# Altium integrated library LEMO Unipole And Multipole Type Connectors.IntLib: 1566 symbols (part 12 of 13) (continued)
## PKG.M1.0GL.NG
designator J?
Fixed receptacle with two nuts (back panel mounting), straight print contacts, Key (G), P series, Multipole Type with 10 Contacts; Manufacturer: LEMO; PartNumber: PKG.M1.0GL.NG; Number of contacts: 10; Contact Diameter: 0.5 mm; Test voltage (kV rms) Contact-Contact: 0.85; Rated Current(A): 3; DatasheetVersion: Jun-14; PackageReference: PKG.M1.0GL.NG; PackageDescription: Fixed receptacle with two nuts (back panel mounting), straight print contacts, Key(G) for Printed Circuit; Supplier 1: Mouser; Supplier Part Number 1: 736-PKGM10GLNG; Supplier 2: Digi-Key; Supplier Part Number 2: PKG.M1.0GL.NG-ND; ComponentLink1Description: Manufacturer URL; ComponentLink1URL: http://www.lemo.com; ComponentLink2Description: Datasheet; ComponentLink2URL: http://intra.lemo.ch/catalog/ROW/UK_English/P_series_catalog.pdf
footprint PKG.M1.0GL.NG (Socket, Female, Height 33.5 mm, Through hole)
pins: 1, 2, 3, 4, 5, 6, 7, 8, 9, 10

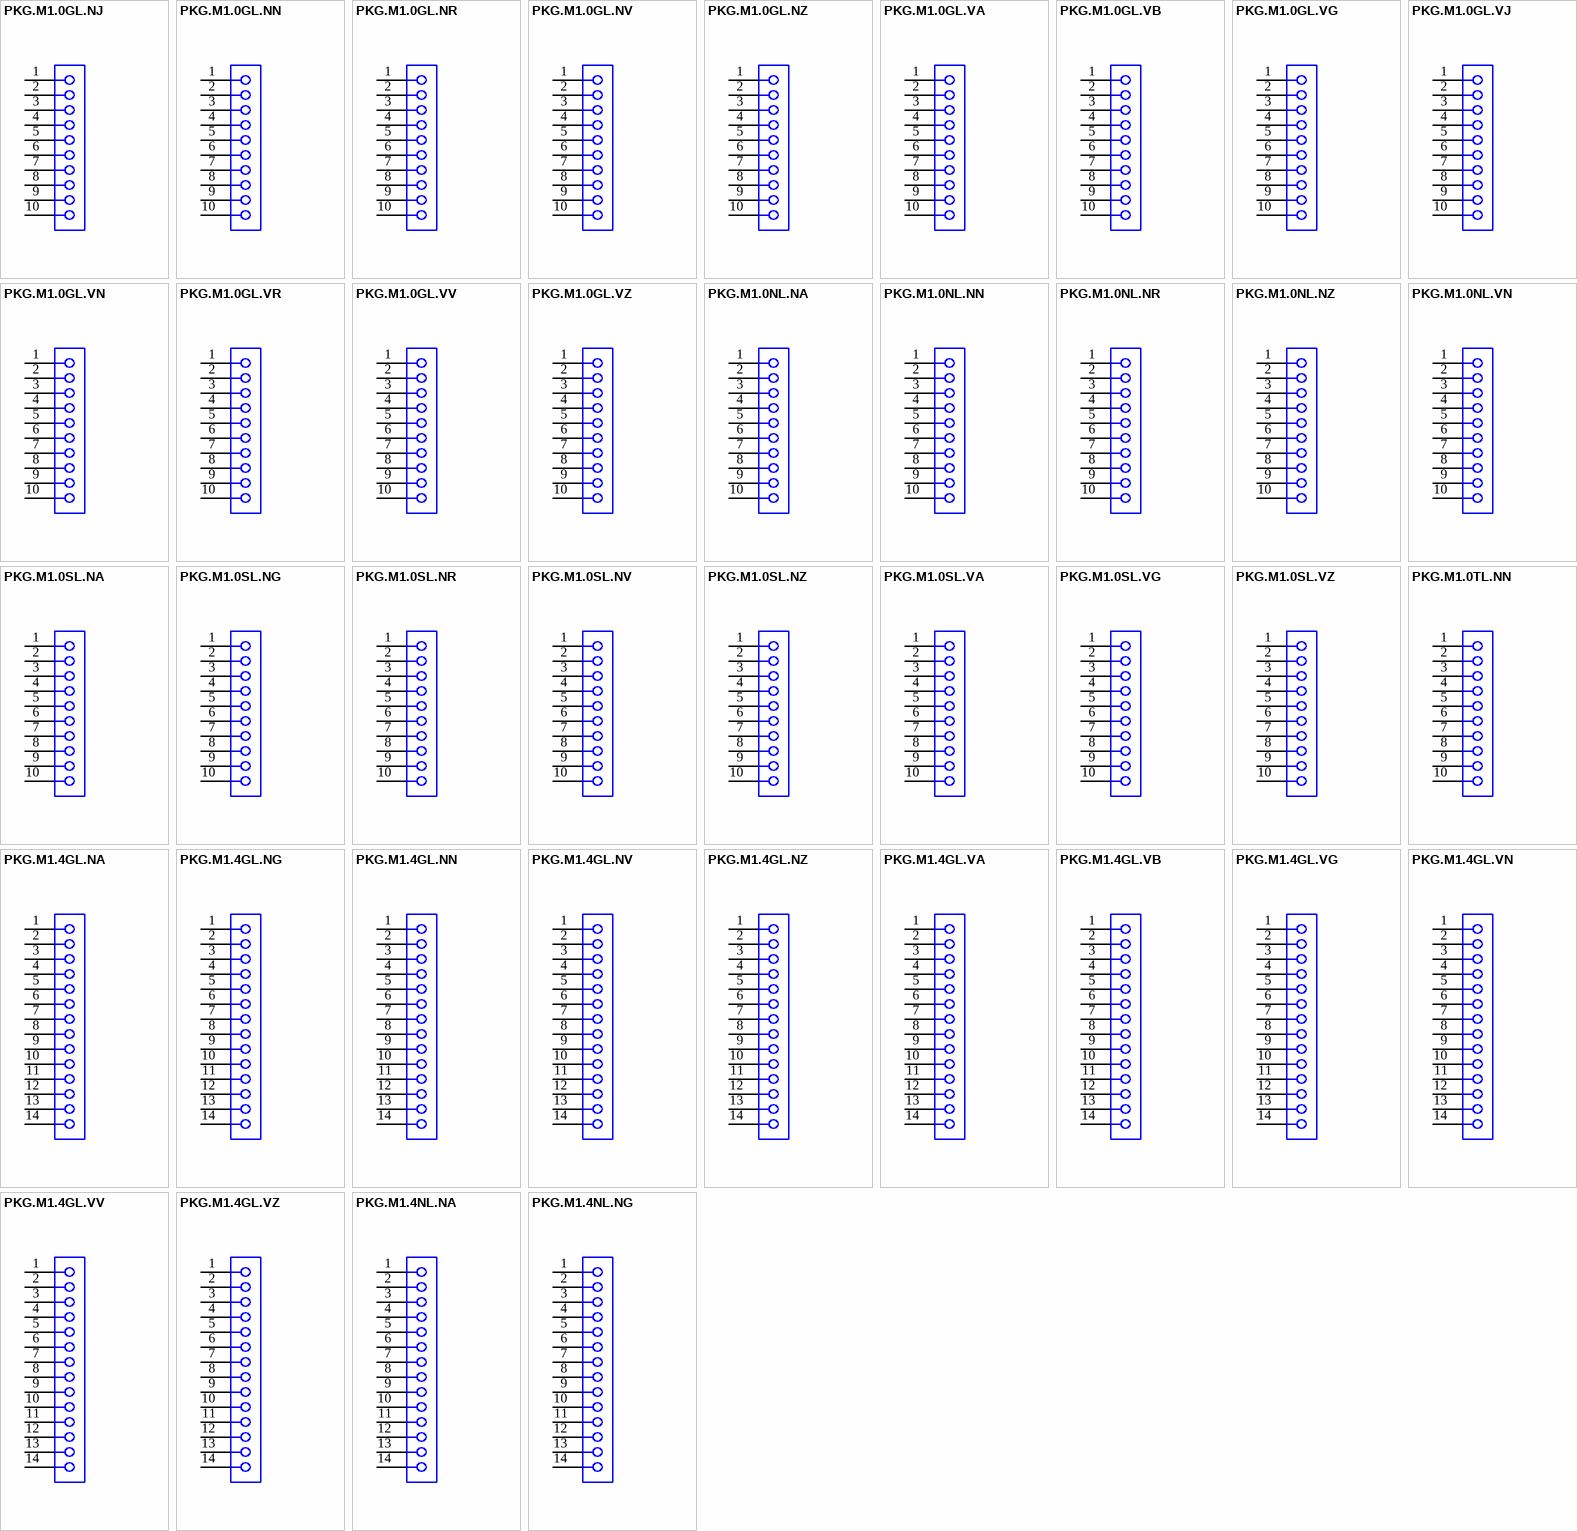
[diagram p39: symbols PKG.M1.0GL.NJ to PKG.M1.4NL.NG]

## PKG.M1.0GL.NJ
designator J?
Fixed receptacle with two nuts (back panel mounting), straight print contacts, Key (G), P series, Multipole Type with 10 Contacts; Manufacturer: LEMO; PartNumber: PKG.M1.0GL.NJ; Number of contacts: 10; Contact Diameter: 0.5 mm; Test voltage (kV rms) Contact-Contact: 0.85; Rated Current(A): 3; DatasheetVersion: Jun-14; PackageReference: PKG.M1.0GL.NJ; PackageDescription: Fixed receptacle with two nuts (back panel mounting), straight print contacts, Key(G) for Printed Circuit; ComponentLink1Description: Manufacturer URL; ComponentLink1URL: http://www.lemo.com; ComponentLink2Description: Datasheet; ComponentLink2URL: http://intra.lemo.ch/catalog/ROW/UK_English/P_series_catalog.pdf
footprint PKG.M1.0GL.NJ (Socket, Female, Height 33.5 mm, Through hole)
pins: 1, 2, 3, 4, 5, 6, 7, 8, 9, 10

## PKG.M1.0GL.NN
designator J?
Fixed receptacle with two nuts (back panel mounting), straight print contacts, Key (G), P series, Multipole Type with 10 Contacts; Manufacturer: LEMO; PartNumber: PKG.M1.0GL.NN; Number of contacts: 10; Contact Diameter: 0.5 mm; Test voltage (kV rms) Contact-Contact: 0.85; Rated Current(A): 3; DatasheetVersion: Jun-14; PackageReference: PKG.M1.0GL.NN; PackageDescription: Fixed receptacle with two nuts (back panel mounting), straight print contacts, Key(G) for Printed Circuit; ComponentLink1Description: Manufacturer URL; ComponentLink1URL: http://www.lemo.com; ComponentLink2Description: Datasheet; ComponentLink2URL: http://intra.lemo.ch/catalog/ROW/UK_English/P_series_catalog.pdf
footprint PKG.M1.0GL.NN (Socket, Female, Height 33.5 mm, Through hole)
pins: 1, 2, 3, 4, 5, 6, 7, 8, 9, 10

## PKG.M1.0GL.NR
designator J?
Fixed receptacle with two nuts (back panel mounting), straight print contacts, Key (G), P series, Multipole Type with 10 Contacts; Manufacturer: LEMO; PartNumber: PKG.M1.0GL.NR; Number of contacts: 10; Contact Diameter: 0.5 mm; Test voltage (kV rms) Contact-Contact: 0.85; Rated Current(A): 3; DatasheetVersion: Jun-14; PackageReference: PKG.M1.0GL.NR; PackageDescription: Fixed receptacle with two nuts (back panel mounting), straight print contacts, Key(G) for Printed Circuit; ComponentLink1Description: Manufacturer URL; ComponentLink1URL: http://www.lemo.com; ComponentLink2Description: Datasheet; ComponentLink2URL: http://intra.lemo.ch/catalog/ROW/UK_English/P_series_catalog.pdf
footprint PKG.M1.0GL.NR (Socket, Female, Height 33.5 mm, Through hole)
pins: 1, 2, 3, 4, 5, 6, 7, 8, 9, 10

## PKG.M1.0GL.NV
designator J?
Fixed receptacle with two nuts (back panel mounting), straight print contacts, Key (G), P series, Multipole Type with 10 Contacts; Manufacturer: LEMO; PartNumber: PKG.M1.0GL.NV; Number of contacts: 10; Contact Diameter: 0.5 mm; Test voltage (kV rms) Contact-Contact: 0.85; Rated Current(A): 3; DatasheetVersion: Jun-14; PackageReference: PKG.M1.0GL.NV; PackageDescription: Fixed receptacle with two nuts (back panel mounting), straight print contacts, Key(G) for Printed Circuit; ComponentLink1Description: Manufacturer URL; ComponentLink1URL: http://www.lemo.com; ComponentLink2Description: Datasheet; ComponentLink2URL: http://intra.lemo.ch/catalog/ROW/UK_English/P_series_catalog.pdf
footprint PKG.M1.0GL.NV (Socket, Female, Height 33.5 mm, Through hole)
pins: 1, 2, 3, 4, 5, 6, 7, 8, 9, 10

## PKG.M1.0GL.NZ
designator J?
Fixed receptacle with 1 nut (without 2nd front nut), Key (G), P series, Multipole Type with 10 Contacts; Manufacturer: LEMO; PartNumber: PKG.M1.0GL.NZ; Number of contacts: 10; Contact Diameter: 0.5 mm; Test voltage (kV rms) Contact-Contact: 0.85; Rated Current(A): 3; DatasheetVersion: Jun-14; PackageReference: PKG.M1.0GL.NZ; PackageDescription: Fixed receptacle with 1 nut (without 2nd front nut), Key(G) for Printed Circuit; Supplier 1: Mouser; Supplier Part Number 1: 736-PKGM10GLNZ; Supplier 2: Digi-Key; Supplier Part Number 2: PKG.M1.0GL.NZ-ND; ComponentLink1Description: Manufacturer URL; ComponentLink1URL: http://www.lemo.com; ComponentLink2Description: Datasheet; ComponentLink2URL: http://intra.lemo.ch/catalog/ROW/UK_English/P_series_catalog.pdf
footprint PKG.M1.0GL.NZ (Socket, Female, Height 25 mm, Through hole)
pins: 1, 2, 3, 4, 5, 6, 7, 8, 9, 10

## PKG.M1.0GL.VA
designator J?
Fixed receptacle with two nuts (back panel mounting), 90° print contacts, Key (G), P series, Multipole Type with 10 Contacts; Manufacturer: LEMO; PartNumber: PKG.M1.0GL.VA; Number of contacts: 10; Contact Diameter: 0.5 mm; Test voltage (kV rms) Contact-Contact: 0.85; Rated Current(A): 3; DatasheetVersion: Jun-14; PackageReference: PKG.M1.0GL.VA; PackageDescription: Fixed receptacle with two nuts (back panel mounting), 90° print contacts, Key(G) for Printed Circuit; Supplier 1: Mouser; Supplier Part Number 1: N/A; ComponentLink1Description: Manufacturer URL; ComponentLink1URL: http://www.lemo.com; ComponentLink2Description: Datasheet; ComponentLink2URL: http://intra.lemo.ch/catalog/ROW/UK_English/P_series_catalog.pdf
footprint PKG.M1.0GL.VA (Socket, Female, Height 33.5 mm, Through hole)
pins: 1, 2, 3, 4, 5, 6, 7, 8, 9, 10

## PKG.M1.0GL.VB
designator J?
Fixed receptacle with two nuts (back panel mounting), 90° print contacts, Key (G), P series, Multipole Type with 10 Contacts; Manufacturer: LEMO; PartNumber: PKG.M1.0GL.VB; Number of contacts: 10; Contact Diameter: 0.5 mm; Test voltage (kV rms) Contact-Contact: 0.85; Rated Current(A): 3; DatasheetVersion: Jun-14; PackageReference: PKG.M1.0GL.VB; PackageDescription: Fixed receptacle with two nuts (back panel mounting), 90° print contacts, Key(G) for Printed Circuit; ComponentLink1Description: Manufacturer URL; ComponentLink1URL: http://www.lemo.com; ComponentLink2Description: Datasheet; ComponentLink2URL: http://intra.lemo.ch/catalog/ROW/UK_English/P_series_catalog.pdf
footprint PKG.M1.0GL.VB (Socket, Female, Height 33.5 mm, Through hole)
pins: 1, 2, 3, 4, 5, 6, 7, 8, 9, 10

## PKG.M1.0GL.VG
designator J?
Fixed receptacle with two nuts (back panel mounting), 90° print contacts, Key (G), P series, Multipole Type with 10 Contacts; Manufacturer: LEMO; PartNumber: PKG.M1.0GL.VG; Number of contacts: 10; Contact Diameter: 0.5 mm; Test voltage (kV rms) Contact-Contact: 0.85; Rated Current(A): 3; DatasheetVersion: Jun-14; PackageReference: PKG.M1.0GL.VG; PackageDescription: Fixed receptacle with two nuts (back panel mounting), 90° print contacts, Key(G) for Printed Circuit; Supplier 1: Mouser; Supplier Part Number 1: 736-PKG.M1.0GL.VG; Supplier 2: Digi-Key; Supplier Part Number 2: PKG.M1.0GL.VG-ND; ComponentLink1Description: Manufacturer URL; ComponentLink1URL: http://www.lemo.com; ComponentLink2Description: Datasheet; ComponentLink2URL: http://intra.lemo.ch/catalog/ROW/UK_English/P_series_catalog.pdf
footprint PKG.M1.0GL.VG (Socket, Female, Height 33.5 mm, Through hole)
pins: 1, 2, 3, 4, 5, 6, 7, 8, 9, 10

## PKG.M1.0GL.VJ
designator J?
Fixed receptacle with two nuts (back panel mounting), 90° print contacts, Key (G), P series, Multipole Type with 10 Contacts; Manufacturer: LEMO; PartNumber: PKG.M1.0GL.VJ; Number of contacts: 10; Contact Diameter: 0.5 mm; Test voltage (kV rms) Contact-Contact: 0.85; Rated Current(A): 3; DatasheetVersion: Jun-14; PackageReference: PKG.M1.0GL.VJ; PackageDescription: Fixed receptacle with two nuts (back panel mounting), 90° print contacts, Key(G) for Printed Circuit; ComponentLink1Description: Manufacturer URL; ComponentLink1URL: http://www.lemo.com; ComponentLink2Description: Datasheet; ComponentLink2URL: http://intra.lemo.ch/catalog/ROW/UK_English/P_series_catalog.pdf
footprint PKG.M1.0GL.VJ (Socket, Female, Height 33.5 mm, Through hole)
pins: 1, 2, 3, 4, 5, 6, 7, 8, 9, 10

## PKG.M1.0GL.VN
designator J?
Fixed receptacle with two nuts (back panel mounting), 90° print contacts, Key (G), P series, Multipole Type with 10 Contacts; Manufacturer: LEMO; PartNumber: PKG.M1.0GL.VN; Number of contacts: 10; Contact Diameter: 0.5 mm; Test voltage (kV rms) Contact-Contact: 0.85; Rated Current(A): 3; DatasheetVersion: Jun-14; PackageReference: PKG.M1.0GL.VN; PackageDescription: Fixed receptacle with two nuts (back panel mounting), 90° print contacts, Key(G) for Printed Circuit; ComponentLink1Description: Manufacturer URL; ComponentLink1URL: http://www.lemo.com; ComponentLink2Description: Datasheet; ComponentLink2URL: http://intra.lemo.ch/catalog/ROW/UK_English/P_series_catalog.pdf
footprint PKG.M1.0GL.VN (Socket, Female, Height 33.5 mm, Through hole)
pins: 1, 2, 3, 4, 5, 6, 7, 8, 9, 10

## PKG.M1.0GL.VR
designator J?
Fixed receptacle with two nuts (back panel mounting), 90° print contacts, Key (G), P series, Multipole Type with 10 Contacts; Manufacturer: LEMO; PartNumber: PKG.M1.0GL.VR; Number of contacts: 10; Contact Diameter: 0.5 mm; Test voltage (kV rms) Contact-Contact: 0.85; Rated Current(A): 3; DatasheetVersion: Jun-14; PackageReference: PKG.M1.0GL.VR; PackageDescription: Fixed receptacle with two nuts (back panel mounting), 90° print contacts, Key(G) for Printed Circuit; ComponentLink1Description: Manufacturer URL; ComponentLink1URL: http://www.lemo.com; ComponentLink2Description: Datasheet; ComponentLink2URL: http://intra.lemo.ch/catalog/ROW/UK_English/P_series_catalog.pdf
footprint PKG.M1.0GL.VR (Socket, Female, Height 33.5 mm, Through hole)
pins: 1, 2, 3, 4, 5, 6, 7, 8, 9, 10

## PKG.M1.0GL.VV
designator J?
Fixed receptacle with two nuts (back panel mounting), 90° print contacts, Key (G), P series, Multipole Type with 10 Contacts; Manufacturer: LEMO; PartNumber: PKG.M1.0GL.VV; Number of contacts: 10; Contact Diameter: 0.5 mm; Test voltage (kV rms) Contact-Contact: 0.85; Rated Current(A): 3; DatasheetVersion: Jun-14; PackageReference: PKG.M1.0GL.VV; PackageDescription: Fixed receptacle with two nuts (back panel mounting), 90° print contacts, Key(G) for Printed Circuit; ComponentLink1Description: Manufacturer URL; ComponentLink1URL: http://www.lemo.com; ComponentLink2Description: Datasheet; ComponentLink2URL: http://intra.lemo.ch/catalog/ROW/UK_English/P_series_catalog.pdf
footprint PKG.M1.0GL.VV (Socket, Female, Height 33.5 mm, Through hole)
pins: 1, 2, 3, 4, 5, 6, 7, 8, 9, 10

## PKG.M1.0GL.VZ
designator J?
Fixed receptacle with 1 nut (without 2nd front nut), Key (G), P series, Multipole Type with 10 Contacts; Manufacturer: LEMO; PartNumber: PKG.M1.0GL.VZ; Number of contacts: 10; Contact Diameter: 0.5 mm; Test voltage (kV rms) Contact-Contact: 0.85; Rated Current(A): 3; DatasheetVersion: Jun-14; PackageReference: PKG.M1.0GL.VZ; PackageDescription: Fixed receptacle with 1 nut (without 2nd front nut), Key(G) for Printed Circuit; Supplier 1: Mouser; Supplier Part Number 1: 736-PKGM10GLVZ; ComponentLink1Description: Manufacturer URL; ComponentLink1URL: http://www.lemo.com; ComponentLink2Description: Datasheet; ComponentLink2URL: http://intra.lemo.ch/catalog/ROW/UK_English/P_series_catalog.pdf
footprint PKG.M1.0GL.VZ (Socket, Female, Height 33.5 mm, Through hole)
pins: 1, 2, 3, 4, 5, 6, 7, 8, 9, 10

## PKG.M1.0NL.NA
designator J?
Fixed receptacle with two nuts (back panel mounting), straight print contacts, Key (G), P series, Multipole Type with 10 Contacts; Manufacturer: LEMO; PartNumber: PKG.M1.0NL.NA; Number of contacts: 10; Contact Diameter: 0.5 mm; Test voltage (kV rms) Contact-Contact: 0.85; Rated Current(A): 3; DatasheetVersion: Jun-14; PackageReference: PKG.M1.0NL.NA; PackageDescription: Fixed receptacle with two nuts (back panel mounting), straight print contacts, Key(G) for Printed Circuit; ComponentLink1Description: Manufacturer URL; ComponentLink1URL: http://www.lemo.com; ComponentLink2Description: Datasheet; ComponentLink2URL: http://intra.lemo.ch/catalog/ROW/UK_English/P_series_catalog.pdf
footprint PKG.M1.0NL.NA (Socket, Female, Height 33.5 mm, Through hole)
pins: 1, 2, 3, 4, 5, 6, 7, 8, 9, 10

## PKG.M1.0NL.NN
designator J?
Fixed receptacle with two nuts (back panel mounting), straight print contacts, Key (G), P series, Multipole Type with 10 Contacts; Manufacturer: LEMO; PartNumber: PKG.M1.0NL.NN; Number of contacts: 10; Contact Diameter: 0.5 mm; Test voltage (kV rms) Contact-Contact: 0.85; Rated Current(A): 3; DatasheetVersion: Jun-14; PackageReference: PKG.M1.0NL.NN; PackageDescription: Fixed receptacle with two nuts (back panel mounting), straight print contacts, Key(G) for Printed Circuit; ComponentLink1Description: Manufacturer URL; ComponentLink1URL: http://www.lemo.com; ComponentLink2Description: Datasheet; ComponentLink2URL: http://intra.lemo.ch/catalog/ROW/UK_English/P_series_catalog.pdf
footprint PKG.M1.0NL.NN (Socket, Female, Height 33.5 mm, Through hole)
pins: 1, 2, 3, 4, 5, 6, 7, 8, 9, 10

## PKG.M1.0NL.NR
designator J?
Fixed receptacle with two nuts (back panel mounting), straight print contacts, Key (G), P series, Multipole Type with 10 Contacts; Manufacturer: LEMO; PartNumber: PKG.M1.0NL.NR; Number of contacts: 10; Contact Diameter: 0.5 mm; Test voltage (kV rms) Contact-Contact: 0.85; Rated Current(A): 3; DatasheetVersion: Jun-14; PackageReference: PKG.M1.0NL.NR; PackageDescription: Fixed receptacle with two nuts (back panel mounting), straight print contacts, Key(G) for Printed Circuit; ComponentLink1Description: Manufacturer URL; ComponentLink1URL: http://www.lemo.com; ComponentLink2Description: Datasheet; ComponentLink2URL: http://intra.lemo.ch/catalog/ROW/UK_English/P_series_catalog.pdf
footprint PKG.M1.0NL.NR (Socket, Female, Height 33.5 mm, Through hole)
pins: 1, 2, 3, 4, 5, 6, 7, 8, 9, 10

## PKG.M1.0NL.NZ
designator J?
Fixed receptacle with 1 nut (without 2nd front nut), Key (G), P series, Multipole Type with 10 Contacts; Manufacturer: LEMO; PartNumber: PKG.M1.0NL.NZ; Number of contacts: 10; Contact Diameter: 0.5 mm; Test voltage (kV rms) Contact-Contact: 0.85; Rated Current(A): 3; DatasheetVersion: Jun-14; PackageReference: PKG.M1.0NL.NZ; PackageDescription: Fixed receptacle with 1 nut (without 2nd front nut), Key(G) for Printed Circuit; ComponentLink1Description: Manufacturer URL; ComponentLink1URL: http://www.lemo.com; ComponentLink2Description: Datasheet; ComponentLink2URL: http://intra.lemo.ch/catalog/ROW/UK_English/P_series_catalog.pdf
footprint PKG.M1.0NL.NZ (Socket, Female, Height 25 mm, Through hole)
pins: 1, 2, 3, 4, 5, 6, 7, 8, 9, 10

## PKG.M1.0NL.VN
designator J?
Fixed receptacle with two nuts (back panel mounting), 90° print contacts, Key (G), P series, Multipole Type with 10 Contacts; Manufacturer: LEMO; PartNumber: PKG.M1.0NL.VN; Number of contacts: 10; Contact Diameter: 0.5 mm; Test voltage (kV rms) Contact-Contact: 0.85; Rated Current(A): 3; DatasheetVersion: Jun-14; PackageReference: PKG.M1.0NL.VN; PackageDescription: Fixed receptacle with two nuts (back panel mounting), 90° print contacts, Key(G) for Printed Circuit; ComponentLink1Description: Manufacturer URL; ComponentLink1URL: http://www.lemo.com; ComponentLink2Description: Datasheet; ComponentLink2URL: http://intra.lemo.ch/catalog/ROW/UK_English/P_series_catalog.pdf
footprint PKG.M1.0NL.VN (Socket, Female, Height 33.5 mm, Through hole)
pins: 1, 2, 3, 4, 5, 6, 7, 8, 9, 10

## PKG.M1.0SL.NA
designator J?
Fixed receptacle with two nuts (back panel mounting), straight print contacts, Key (G),  series, Multipole Type with 10 Contacts; Manufacturer: LEMO; PartNumber: PKG.M1.0SL.NA; Number of contacts: 10; Contact Diameter: 0.5 mm; Test voltage (kV rms) Contact-Contact: 0.85; Rated Current(A): 3; DatasheetVersion: Jun-14; PackageReference: PKG.M1.0SL.NA; PackageDescription: Fixed receptacle with two nuts (back panel mounting), straight print contacts, Key(G) for Printed Circuit; Supplier 1: Mouser; Supplier Part Number 1: 736-PKGM10SLNA; Supplier 2: Digi-Key; Supplier Part Number 2: PKG.M1.0SL.NA-ND; ComponentLink1Description: Manufacturer URL; ComponentLink1URL: http://www.lemo.com; ComponentLink2Description: Datasheet; ComponentLink2URL: http://intra.lemo.ch/catalog/ROW/UK_English/P_series_catalog.pdf
footprint PKG.M1.0SL.NA (Socket, Female, Height 33.5 mm, Through hole)
pins: 1, 2, 3, 4, 5, 6, 7, 8, 9, 10

## PKG.M1.0SL.NG
designator J?
Fixed receptacle with two nuts (back panel mounting), straight print contacts, Key (G), P series, Multipole Type with 10 Contacts; Manufacturer: LEMO; PartNumber: PKG.M1.0SL.NG; Number of contacts: 10; Contact Diameter: 0.5 mm; Test voltage (kV rms) Contact-Contact: 0.85; Rated Current(A): 3; DatasheetVersion: Jun-14; PackageReference: PKG.M1.0SL.NG; PackageDescription: Fixed receptacle with two nuts (back panel mounting), straight print contacts, Key(G) for Printed Circuit; Supplier 1: Mouser; Supplier Part Number 1: 736-PKGM10SLNG; Supplier 2: Digi-Key; Supplier Part Number 2: PKG.M1.0SL.NG-ND; ComponentLink1Description: Manufacturer URL; ComponentLink1URL: http://www.lemo.com; ComponentLink2Description: Datasheet; ComponentLink2URL: http://intra.lemo.ch/catalog/ROW/UK_English/P_series_catalog.pdf
footprint PKG.M1.0SL.NG (Socket, Female, Height 33.5 mm, Through hole)
pins: 1, 2, 3, 4, 5, 6, 7, 8, 9, 10

## PKG.M1.0SL.NR
designator J?
Fixed receptacle with two nuts (back panel mounting), straight print contacts, Key (G),  series, Multipole Type with 10 Contacts; Manufacturer: LEMO; PartNumber: PKG.M1.0SL.NR; Number of contacts: 10; Contact Diameter: 0.5 mm; Test voltage (kV rms) Contact-Contact: 0.85; Rated Current(A): 3; DatasheetVersion: Jun-14; PackageReference: PKG.M1.0SL.NR; PackageDescription: Fixed receptacle with two nuts (back panel mounting), straight print contacts, Key(G) for Printed Circuit; Supplier 1: Mouser; Supplier Part Number 1: 736-PKGM10SLNR; Supplier 2: Digi-Key; Supplier Part Number 2: PKG.M1.0SL.NR-ND; ComponentLink1Description: Manufacturer URL; ComponentLink1URL: http://www.lemo.com; ComponentLink2Description: Datasheet; ComponentLink2URL: http://intra.lemo.ch/catalog/ROW/UK_English/P_series_catalog.pdf
footprint PKG.M1.0SL.NR (Socket, Female, Height 33.5 mm, Through hole)
pins: 1, 2, 3, 4, 5, 6, 7, 8, 9, 10

## PKG.M1.0SL.NV
designator J?
Fixed receptacle with two nuts (back panel mounting), straight print contacts, Key (G), P series, Multipole Type with 10 Contacts; Manufacturer: LEMO; PartNumber: PKG.M1.0SL.NV; Number of contacts: 10; Contact Diameter: 0.5 mm; Test voltage (kV rms) Contact-Contact: 0.85; Rated Current(A): 3; DatasheetVersion: Jun-14; PackageReference: PKG.M1.0SL.NV; PackageDescription: Fixed receptacle with two nuts (back panel mounting), straight print contacts, Key(G) for Printed Circuit; ComponentLink1Description: Manufacturer URL; ComponentLink1URL: http://www.lemo.com; ComponentLink2Description: Datasheet; ComponentLink2URL: http://intra.lemo.ch/catalog/ROW/UK_English/P_series_catalog.pdf
footprint PKG.M1.0SL.NV (Socket, Female, Height 33.5 mm, Through hole)
pins: 1, 2, 3, 4, 5, 6, 7, 8, 9, 10

## PKG.M1.0SL.NZ
designator J?
Fixed receptacle with 1 nut (without 2nd front nut), Key (G), P series, Multipole Type with 10 Contacts; Manufacturer: LEMO; PartNumber: PKG.M1.0SL.NZ; Number of contacts: 10; Contact Diameter: 0.5 mm; Test voltage (kV rms) Contact-Contact: 0.85; Rated Current(A): 3; DatasheetVersion: Jun-14; PackageReference: PKG.M1.0SL.NZ; PackageDescription: Fixed receptacle with 1 nut (without 2nd front nut), Key(G) for Printed Circuit; Supplier 1: Mouser; Supplier Part Number 1: 736-PKGM10SLNZ; Supplier 2: Digi-Key; Supplier Part Number 2: PKG.M1.0SL.NZ-ND; ComponentLink1Description: Manufacturer URL; ComponentLink1URL: http://www.lemo.com; ComponentLink2Description: Datasheet; ComponentLink2URL: http://intra.lemo.ch/catalog/ROW/UK_English/P_series_catalog.pdf
footprint PKG.M1.0SL.NZ (Socket, Female, Height 25 mm, Through hole)
pins: 1, 2, 3, 4, 5, 6, 7, 8, 9, 10

## PKG.M1.0SL.VA
designator J?
Fixed receptacle with two nuts (back panel mounting), 90° print contacts, Key (G),  series, Multipole Type with 10 Contacts; Manufacturer: LEMO; PartNumber: PKG.M1.0SL.VA; Number of contacts: 10; Contact Diameter: 0.5 mm; Test voltage (kV rms) Contact-Contact: 0.85; Rated Current(A): 3; DatasheetVersion: Jun-14; PackageReference: PKG.M1.0SL.VA; PackageDescription: Fixed receptacle with two nuts (back panel mounting), 90° print contacts, Key(G) for Printed Circuit; Supplier 1: Mouser; Supplier Part Number 1: 736-PKGM10SLVA; Supplier 2: Digi-Key; Supplier Part Number 2: PKG.M1.0SL.VA-ND; ComponentLink1Description: Manufacturer URL; ComponentLink1URL: http://www.lemo.com; ComponentLink2Description: Datasheet; ComponentLink2URL: http://intra.lemo.ch/catalog/ROW/UK_English/P_series_catalog.pdf
footprint PKG.M1.0SL.VA (Socket, Female, Height 33.5 mm, Through hole)
pins: 1, 2, 3, 4, 5, 6, 7, 8, 9, 10

## PKG.M1.0SL.VG
designator J?
Fixed receptacle with two nuts (back panel mounting), 90° print contacts, Key (G), P series, Multipole Type with 10 Contacts; Manufacturer: LEMO; PartNumber: PKG.M1.0SL.VG; Number of contacts: 10; Contact Diameter: 0.5 mm; Test voltage (kV rms) Contact-Contact: 0.85; Rated Current(A): 3; DatasheetVersion: Jun-14; PackageReference: PKG.M1.0SL.VG; PackageDescription: Fixed receptacle with two nuts (back panel mounting), 90° print contacts, Key(G) for Printed Circuit; Supplier 1: Mouser; Supplier Part Number 1: 736-PKGM10SLVG; Supplier 2: Digi-Key; Supplier Part Number 2: PKG.M1.0SL.VG-ND; ComponentLink1Description: Manufacturer URL; ComponentLink1URL: http://www.lemo.com; ComponentLink2Description: Datasheet; ComponentLink2URL: http://intra.lemo.ch/catalog/ROW/UK_English/P_series_catalog.pdf
footprint PKG.M1.0SL.VG (Socket, Female, Height 33.5 mm, Through hole)
pins: 1, 2, 3, 4, 5, 6, 7, 8, 9, 10

## PKG.M1.0SL.VZ
designator J?
Fixed receptacle with 1 nut (without 2nd front nut), Key (G), P series, Multipole Type with 10 Contacts; Manufacturer: LEMO; PartNumber: PKG.M1.0SL.VZ; Number of contacts: 10; Contact Diameter: 0.5 mm; Test voltage (kV rms) Contact-Contact: 0.85; Rated Current(A): 3; DatasheetVersion: Jun-14; PackageReference: PKG.M1.0SL.VZ; PackageDescription: Fixed receptacle with 1 nut (without 2nd front nut), Key(G) for Printed Circuit; Supplier 1: Mouser; Supplier Part Number 1: 736-PKGM10SLVZ; Supplier 2: Digi-Key; Supplier Part Number 2: PKG.M1.0SL.VZ-ND; ComponentLink1Description: Manufacturer URL; ComponentLink1URL: http://www.lemo.com; ComponentLink2Description: Datasheet; ComponentLink2URL: http://intra.lemo.ch/catalog/ROW/UK_English/P_series_catalog.pdf
footprint PKG.M1.0SL.VZ (Socket, Female, Height 33.5 mm, Through hole)
pins: 1, 2, 3, 4, 5, 6, 7, 8, 9, 10

## PKG.M1.0TL.NN
designator J?
Fixed receptacle with two nuts (back panel mounting), straight print contacts, Key (G), P series, Multipole Type with 10 Contacts; Manufacturer: LEMO; PartNumber: PKG.M1.0TL.NN; Number of contacts: 10; Contact Diameter: 0.5 mm; Test voltage (kV rms) Contact-Contact: 0.85; Rated Current(A): 3; DatasheetVersion: Jun-14; PackageReference: PKG.M1.0TL.NN; PackageDescription: Fixed receptacle with two nuts (back panel mounting), straight print contacts, Key(G) for Printed Circuit; Supplier 1: Mouser; Supplier Part Number 1: 736-PKGM10TLNN; Supplier 2: Digi-Key; Supplier Part Number 2: PKG.M1.0TL.NN-ND; ComponentLink1Description: Manufacturer URL; ComponentLink1URL: http://www.lemo.com; ComponentLink2Description: Datasheet; ComponentLink2URL: http://intra.lemo.ch/catalog/ROW/UK_English/P_series_catalog.pdf
footprint PKG.M1.0TL.NN (Socket, Female, Height 33.5 mm, Through hole)
pins: 1, 2, 3, 4, 5, 6, 7, 8, 9, 10

## PKG.M1.4GL.NA
designator J?
Fixed receptacle with two nuts (back panel mounting), straight print contacts, Key (G), P series, Multipole Type with 14 Contacts; Manufacturer: LEMO; PartNumber: PKG.M1.4GL.NA; Number of contacts: 14; Contact Diameter: 0.5 mm; Test voltage (kV rms) Contact-Contact: 0.6; Rated Current(A): 2; DatasheetVersion: Jun-14; PackageReference: PKG.M1.4GL.NA; PackageDescription: Fixed receptacle with two nuts (back panel mounting), straight print contacts, Key(G) for Printed Circuit; ComponentLink1Description: Manufacturer URL; ComponentLink1URL: http://www.lemo.com; ComponentLink2Description: Datasheet; ComponentLink2URL: http://intra.lemo.ch/catalog/ROW/UK_English/P_series_catalog.pdf
footprint PKG.M1.4GL.NA (Socket, Female, Height 33.5 mm, Through hole)
pins: 1, 2, 3, 4, 5, 6, 7, 8, 9, 10, 11, 12, 13, 14

## PKG.M1.4GL.NG
designator J?
Fixed receptacle with two nuts (back panel mounting), straight print contacts, Key (G), P series, Multipole Type with 14 Contacts; Manufacturer: LEMO; PartNumber: PKG.M1.4GL.NG; Number of contacts: 14; Contact Diameter: 0.5 mm; Test voltage (kV rms) Contact-Contact: 0.6; Rated Current(A): 2; DatasheetVersion: Jun-14; PackageReference: PKG.M1.4GL.NG; PackageDescription: Fixed receptacle with two nuts (back panel mounting), straight print contacts, Key(G) for Printed Circuit; ComponentLink1Description: Manufacturer URL; ComponentLink1URL: http://www.lemo.com; ComponentLink2Description: Datasheet; ComponentLink2URL: http://intra.lemo.ch/catalog/ROW/UK_English/P_series_catalog.pdf
footprint PKG.M1.4GL.NG (Socket, Female, Height 33.5 mm, Through hole)
pins: 1, 2, 3, 4, 5, 6, 7, 8, 9, 10, 11, 12, 13, 14

## PKG.M1.4GL.NN
designator J?
Fixed receptacle with two nuts (back panel mounting), straight print contacts, Key (G), P series, Multipole Type with 14 Contacts; Manufacturer: LEMO; PartNumber: PKG.M1.4GL.NN; Number of contacts: 14; Contact Diameter: 0.5 mm; Test voltage (kV rms) Contact-Contact: 0.6; Rated Current(A): 2; DatasheetVersion: Jun-14; PackageReference: PKG.M1.4GL.NN; PackageDescription: Fixed receptacle with two nuts (back panel mounting), straight print contacts, Key(G) for Printed Circuit; ComponentLink1Description: Manufacturer URL; ComponentLink1URL: http://www.lemo.com; ComponentLink2Description: Datasheet; ComponentLink2URL: http://intra.lemo.ch/catalog/ROW/UK_English/P_series_catalog.pdf
footprint PKG.M1.4GL.NN (Socket, Female, Height 33.5 mm, Through hole)
pins: 1, 2, 3, 4, 5, 6, 7, 8, 9, 10, 11, 12, 13, 14

## PKG.M1.4GL.NV
designator J?
Fixed receptacle with two nuts (back panel mounting), straight print contacts, Key (G), P series, Multipole Type with 14 Contacts; Manufacturer: LEMO; PartNumber: PKG.M1.4GL.NV; Number of contacts: 14; Contact Diameter: 0.5 mm; Test voltage (kV rms) Contact-Contact: 0.6; Rated Current(A): 2; DatasheetVersion: Jun-14; PackageReference: PKG.M1.4GL.NV; PackageDescription: Fixed receptacle with two nuts (back panel mounting), straight print contacts, Key(G) for Printed Circuit; ComponentLink1Description: Manufacturer URL; ComponentLink1URL: http://www.lemo.com; ComponentLink2Description: Datasheet; ComponentLink2URL: http://intra.lemo.ch/catalog/ROW/UK_English/P_series_catalog.pdf
footprint PKG.M1.4GL.NV (Socket, Female, Height 33.5 mm, Through hole)
pins: 1, 2, 3, 4, 5, 6, 7, 8, 9, 10, 11, 12, 13, 14